# Altium footprint library Indruino.PcbLib: 383 footprints (part 19 of 24)
Each footprint in its own frame and in the unit in brackets; x right, y up, seen from the top. Pads: shape width x height; smd on the part's side, far side on the other; paste and mask are expansions set on the pad; w line width, h text height; cw(c..) or ccw(c..) is an arc to the next point about the centre after c.
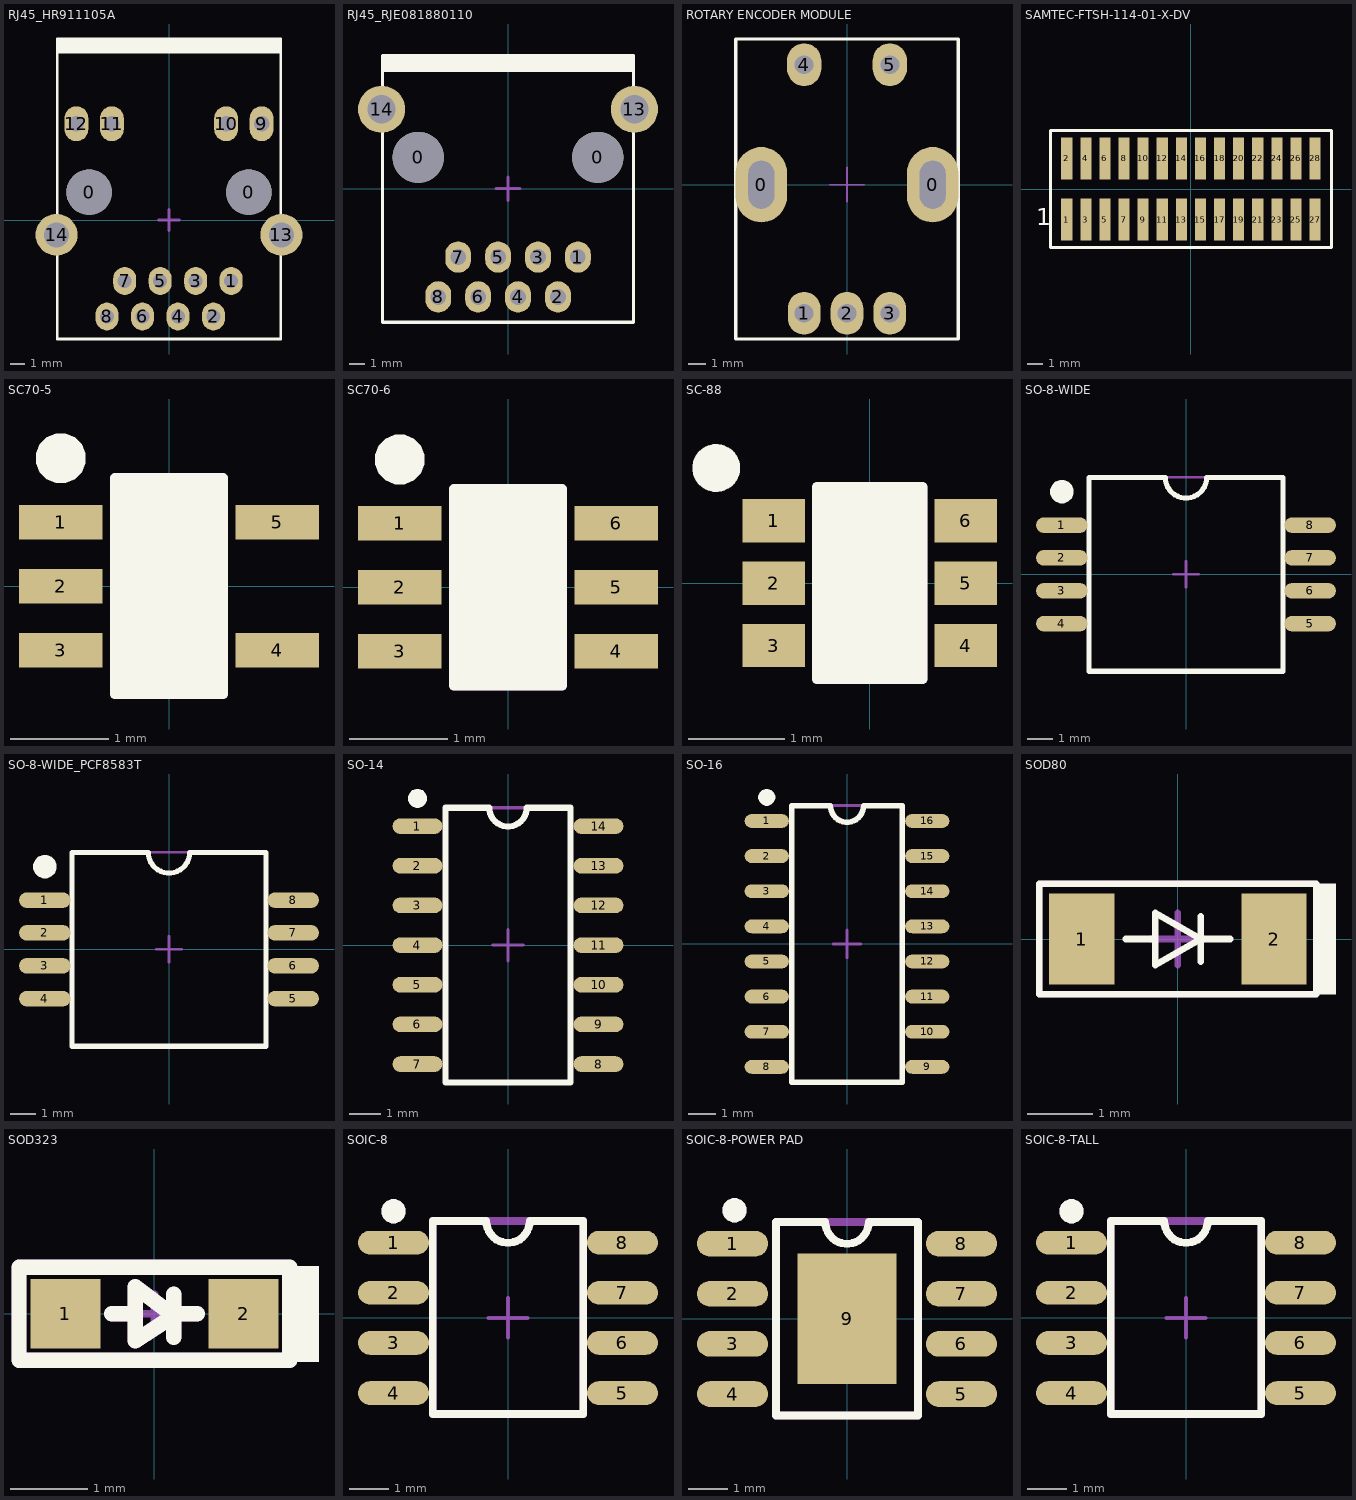
[diagram p18: the footprints below, top view; thin cyan lines are the x and y axes]

## RJ45_HR911105A [mm]
pads (16):
  round 3.25 hole 3.25: 0(-5.715,1.995) 0(5.715,1.995)
  oval 1.65x2 hole 1: 1(4.45,-4.355) 2(3.18,-6.895) 3(1.91,-4.355) 4(0.64,-6.895) 5(-0.63,-4.355) 6(-1.9,-6.895) 7(-3.17,-4.355) 8(-4.44,-6.895)
  oval 1.7x2.5 hole 1.1: 9(6.625,6.895) 10(4.085,6.895) 11(-4.085,6.895) 12(-6.625,6.895)
  round 3 hole 1.8: 13(8.05,-1.055) 14(-8.05,-1.055)
Top Overlay:
  rectangle: -8.001,11.931 8.001,12.961
  lines w0.2: -8.001,-8.509 8.001,-8.509 8.001,12.961 -8.001,12.961 -8.001,-8.509
Mechanical 15:
  lines w0.2: -0.75,0 0.75,0 ; 0,-0.75 0,0.75
3D body "User Library-HR911105A.step": height 13.5, standoff -3, extent -7.94,-8.509 7.94,12.891

## RJ45_RJE081880110 [mm] "Jack Modular Connector 8p8c (RJ45, Ethernet) Vertical Unshielded"
pads (12):
  round 3.25 hole 3.25: 0(-5.715,1.995) 0(5.715,1.995)
  oval 1.65x2 hole 1: 1(4.45,-4.355) 2(3.18,-6.895) 3(1.91,-4.355) 4(0.64,-6.895) 5(-0.63,-4.355) 6(-1.9,-6.895) 7(-3.17,-4.355) 8(-4.44,-6.895)
  round 3 hole 1.8: 13(8.05,5.045) 14(-8.05,5.045)
Top Overlay:
  rectangle: -8.001,7.431 8.001,8.461
  lines w0.2: -8.001,-8.509 8.001,-8.509 8.001,8.46 8,8.461 -8.001,8.461 -8.001,-8.509
Mechanical 15:
  lines w0.2: -0.75,0 0.75,0 ; 0,-0.75 0,0.75
3D body "RJE08-188-0110-REVT1.step": height 16.38, standoff -3.9, extent -7.75,-8.05 7.75,8.45

## ROTARY ENCODER MODULE [mm]
pads (7):
  oval 3x4.4 hole 2.8 slot 1.5 at 0 deg: 0(-5,0) 0(5,0)
  oval 1.9x2.5 hole 1.1: 1(-2.5,-7.5) 2(0,-7.5) 3(2.5,-7.5)
  oval 2x2.5 hole 1.1: 4(-2.5,7) 5(2.5,7)
Top Overlay:
  lines w0.2: -6.5,-9 -6.5,8.5 6.5,8.5 6.5,-9 -6.5,-9
Mechanical 13:
  lines w0.1: -6.5,-9 6.5,-9 6.5,8.5 -6.5,8.5 -6.5,-9
Mechanical 15:
  lines w0.1: -1,0 1,0 ; 0,-1 0,1
3D body "EC11E-05SW.STEP": height 24.5, standoff -3.7, extent -6.539,-7.729 6.56,7.221

## SAMTEC-FTSH-114-01-X-DV [mil]
height 60
pads (28):
  rect 29.13x109.84 smd: 1(-325,-80) 2(-325,80) 3(-275,-80) 4(-275,80) 5(-225,-80) 6(-225,80) 7(-175,-80) 8(-175,80) 9(-125,-80) 10(-125,80) 11(-75,-80) 12(-75,80) 13(-25,-80) 14(-25,80) 15(25,-80) 16(25,80) 17(75,-80) 18(75,80) 19(125,-80) 20(125,80) 21(175,-80) 22(175,80) 23(225,-80) 24(225,80) 25(275,-80) 26(275,80) 27(325,-80) 28(325,80)
Top Overlay:
  lines w7.87: -367.72,-152.68 -367.72,152.68 367.72,152.68 367.72,-152.68 -367.72,-152.68
  text "1" at -405.51,-110.24 h77.5
Top Paste:
  rectangle: -339.57,-134.92 -310.43,-25.08
  rectangle: -339.57,25.08 -310.43,134.92
  rectangle: -289.57,-134.92 -260.43,-25.08
  rectangle: -289.57,25.08 -260.43,134.92
  rectangle: -239.57,-134.92 -210.43,-25.08
  rectangle: -239.57,25.08 -210.43,134.92
  rectangle: -189.57,-134.92 -160.43,-25.08
  rectangle: -189.57,25.08 -160.43,134.92
  rectangle: -139.57,-134.92 -110.43,-25.08
  rectangle: -139.57,25.08 -110.43,134.92
  rectangle: -89.57,-134.92 -60.43,-25.08
  rectangle: -89.57,25.08 -60.43,134.92
  rectangle: -39.57,-134.92 -10.43,-25.08
  rectangle: -39.57,25.08 -10.43,134.92
  rectangle: 10.43,-134.92 39.57,-25.08
  rectangle: 10.43,25.08 39.57,134.92
  rectangle: 60.43,-134.92 89.57,-25.08
  rectangle: 60.43,25.08 89.57,134.92
  rectangle: 110.43,-134.92 139.57,-25.08
  rectangle: 110.43,25.08 139.57,134.92
  rectangle: 160.43,-134.92 189.57,-25.08
  rectangle: 160.43,25.08 189.57,134.92
  rectangle: 210.43,-134.92 239.57,-25.08
  rectangle: 210.43,25.08 239.57,134.92
  rectangle: 260.43,-134.92 289.57,-25.08
  rectangle: 260.43,25.08 289.57,134.92
  rectangle: 310.43,-134.92 339.57,-25.08
  rectangle: 310.43,25.08 339.57,134.92
Top Solder:
  rectangle: -341.58,-136.93 -308.43,-23.07
  rectangle: -341.58,23.07 -308.43,136.93
  rectangle: -291.58,-136.93 -258.43,-23.07
  rectangle: -291.58,23.07 -258.43,136.93
  rectangle: -241.58,-136.93 -208.43,-23.07
  rectangle: -241.58,23.07 -208.43,136.93
  rectangle: -191.58,-136.93 -158.43,-23.07
  rectangle: -191.58,23.07 -158.43,136.93
  rectangle: -141.58,-136.93 -108.43,-23.07
  rectangle: -141.58,23.07 -108.43,136.93
  rectangle: -91.58,-136.93 -58.43,-23.07
  rectangle: -91.58,23.07 -58.43,136.93
  rectangle: -41.58,-136.93 -8.43,-23.07
  rectangle: -41.58,23.07 -8.43,136.93
  rectangle: 8.43,-136.93 41.58,-23.07
  rectangle: 8.43,23.07 41.58,136.93
  rectangle: 58.43,-136.93 91.58,-23.07
  rectangle: 58.43,23.07 91.58,136.93
  rectangle: 108.43,-136.93 141.58,-23.07
  rectangle: 108.43,23.07 141.58,136.93
  rectangle: 158.43,-136.93 191.58,-23.07
  rectangle: 158.43,23.07 191.58,136.93
  rectangle: 208.43,-136.93 241.58,-23.07
  rectangle: 208.43,23.07 241.58,136.93
  rectangle: 258.43,-136.93 291.58,-23.07
  rectangle: 258.43,23.07 291.58,136.93
  rectangle: 308.43,-136.93 341.58,-23.07
  rectangle: 308.43,23.07 341.58,136.93
Mechanical 40:
  text "3.429" at -620.98,-5 h15.5
  text "4.064" at -548.5,-5 h15.5
  text "1.270" at -428.5,190 h15.5
  text "17.780" at -31.5,45 h15.5
  text "16.510" at -31.5,230 h15.5
  text "2.794" at 379.02,75 h15.5
  text "0.762" at 391.5,162.52 h15.5

## SC70-5 [mm] "SC70 5-Leads, Body 2.15x2.4mm, Pitch 0.65mm"
height 1.1
pads (5):
  rect 0.85x0.35 smd: 1(-1.1,0.65) 2(-1.1,0) 3(-1.1,-0.65) 4(1.1,-0.65) 5(1.1,0.65)
Top Overlay:
  region: -0.55,-1.1 0.55,-1.1 0.55,1.1 -0.55,1.1
  region: -1.1,1.05 -1.15,1.05 -1.242,1.088 -1.312,1.158 -1.35,1.25 -1.35,1.3 -1.35,1.35 -1.312,1.442 -1.242,1.512 -1.15,1.55 -1.1,1.55 -1.05,1.55 -0.958,1.512 -0.888,1.442 -0.85,1.35 -0.85,1.3 -0.85,1.25 -0.888,1.158 -0.958,1.088 -1.05,1.05
  lines w0.1: -0.55,-1.1 -0.55,1.1 0.55,1.1 0.55,-1.1 -0.55,-1.1
Mechanical 13:
  lines w0.1: -0.55,-1.1 0.55,-1.1 0.55,1.1 -0.55,1.1 -0.55,-1.1
Mechanical 15:
  lines w0.1: -0.35,0 0.35,0 ; 0,-0.35 0,0.35
3D body "User Library-SOT353-1.STEP": height 1.1, standoff 0, extent -1.2,-1.1 1.2,1.1

## SC70-6 [mm] "SC70 6-Leads, Body 2.15x2.4mm, Pitch 0.65mm"
height 1.1
pads (6):
  rect 0.85x0.35 smd: 1(-1.1,0.65) 2(-1.1,0) 3(-1.1,-0.65) 4(1.1,-0.65) 5(1.1,0) 6(1.1,0.65)
Top Overlay:
  region: -0.55,-1 0.55,-1 0.55,1 -0.55,1
  region: -1.1,1.05 -1.15,1.05 -1.242,1.088 -1.312,1.158 -1.35,1.25 -1.35,1.3 -1.35,1.35 -1.312,1.442 -1.242,1.512 -1.15,1.55 -1.1,1.55 -1.05,1.55 -0.958,1.512 -0.888,1.442 -0.85,1.35 -0.85,1.3 -0.85,1.25 -0.888,1.158 -0.958,1.088 -1.05,1.05
  lines w0.1: -0.55,-1 -0.55,1 0.55,1 0.55,-1 -0.55,-1
Mechanical 13:
  lines w0.1: -0.55,-1 0.55,-1 0.55,1 -0.55,1 -0.55,-1
Mechanical 15:
  lines w0.1: -0.4,0 0.4,0 ; 0,-0.4 0,0.4
3D body "SW3dPS-SC70-6.STEP": height 0.92, standoff -0.03, extent -1.05,-1 1.05,1

## SC-88 [mm] "SOT23, 5-Leads, Body 2.9x1.6mm, Pitch 0.95mm, Lead Span 2.8mm, IPC High Density"
height 1.45
pads (6):
  rect 0.65x0.45 smd: 1(-1,0.65) 2(-1,0) 3(-1,-0.65) 4(1,-0.65) 5(1,0) 6(1,0.65)
Top Overlay:
  circle w0.1: c-1.6,1.2 r0.2
  region: -0.55,-1 0.55,-1 0.55,1.005 -0.55,1.005
  region: -1.6,1 -1.64,1 -1.713,1.03 -1.77,1.087 -1.8,1.16 -1.8,1.2 -1.8,1.24 -1.77,1.313 -1.713,1.37 -1.64,1.4 -1.6,1.4 -1.56,1.4 -1.487,1.37 -1.43,1.313 -1.4,1.24 -1.4,1.2 -1.4,1.16 -1.43,1.087 -1.487,1.03 -1.56,1
  lines w0.1: -0.55,-1 -0.55,1.005 0.55,1.005 0.55,-1 -0.55,-1
Mechanical 13:
  lines w0.1: -0.55,-1 -0.55,1 0.55,1 0.55,-1 -0.55,-1
Mechanical 15:
  lines w0.1: -0.35,0 0.35,0 ; 0,-0.35 0,0.35
3D body "SW3dPS-SC70-6.STEP": height 0.92, standoff -0.03, extent -1.055,-1 1.045,1

## SO-8-WIDE [mm]
pads (8):
  oval 2x0.6 smd: 1(-4.8,1.905) 2(-4.8,0.635) 3(-4.8,-0.635) 4(-4.8,-1.905) 5(4.8,-1.905) 6(4.8,-0.635) 7(4.8,0.635) 8(4.8,1.905)
Top Overlay:
  region: -4.8,2.753 -4.889,2.753 -5.053,2.821 -5.179,2.947 -5.247,3.111 -5.247,3.2 -5.247,3.289 -5.179,3.453 -5.053,3.579 -4.889,3.647 -4.8,3.647 -4.711,3.647 -4.547,3.579 -4.421,3.453 -4.353,3.289 -4.353,3.2 -4.353,3.111 -4.421,2.947 -4.547,2.821 -4.711,2.753
  lines w0.2: -3.75,3.708 -3.75,-3.75 3.75,-3.75 3.75,3.75 0.8,3.75 cw(c0,3.75) -0.8,3.75 -3.75,3.75
Mechanical 13:
  lines w0.1: -3.75,-3.75 3.75,-3.75 3.75,3.75 -3.75,3.75 -3.75,-3.75
Mechanical 15:
  lines w0.1: -0.5,0 0.5,0 ; 0,-0.5 0,0.5
3D body "User Library-SOIC8_Wide_5mmx5mm.step": height 1.75, standoff -0.01, extent -4.052,-2.73 4.05,2.73

## SO-8-WIDE_PCF8583T [mm]
pads (8):
  oval 2x0.6 smd: 1(-4.8,1.905) 2(-4.8,0.635) 3(-4.8,-0.635) 4(-4.8,-1.905) 5(4.8,-1.905) 6(4.8,-0.635) 7(4.8,0.635) 8(4.8,1.905)
Top Overlay:
  region: -4.8,2.753 -4.889,2.753 -5.053,2.821 -5.179,2.947 -5.247,3.111 -5.247,3.2 -5.247,3.289 -5.179,3.453 -5.053,3.579 -4.889,3.647 -4.8,3.647 -4.711,3.647 -4.547,3.579 -4.421,3.453 -4.353,3.289 -4.353,3.2 -4.353,3.111 -4.421,2.947 -4.547,2.821 -4.711,2.753
  lines w0.2: -3.75,3.708 -3.75,-3.75 3.75,-3.75 3.75,3.75 0.8,3.75 cw(c0,3.75) -0.8,3.75 -3.75,3.75
Mechanical 13:
  lines w0.1: -3.75,-3.75 3.75,-3.75 3.75,3.75 -3.75,3.75 -3.75,-3.75
Mechanical 15:
  lines w0.1: -0.5,0 0.5,0 ; 0,-0.5 0,0.5
3D body "User Library-SOIC-8-W7_5mm(SOT176-1).STEP": height 2.5, standoff 0, extent -5.267,-3.825 5.268,3.825

## SO-14 [mm]
pads (14):
  oval 1.6x0.5 smd: 1(-2.9,3.81) 2(-2.9,2.54) 3(-2.9,1.27) 4(-2.9,0) 5(-2.9,-1.27) 6(-2.9,-2.54) 7(-2.9,-3.81) 8(2.9,-3.81) 9(2.9,-2.54) 10(2.9,-1.27) 11(2.9,0) 12(2.9,1.27) 13(2.9,2.54) 14(2.9,3.81)
Top Overlay:
  region: -2.9,4.4 -2.84,4.4 -2.73,4.446 -2.646,4.53 -2.6,4.64 -2.6,4.7 -2.6,4.76 -2.646,4.87 -2.73,4.954 -2.84,5 -2.9,5 -2.96,5 -3.07,4.954 -3.154,4.87 -3.2,4.76 -3.2,4.7 -3.2,4.64 -3.154,4.53 -3.07,4.446 -2.96,4.4
  lines w0.2: -2,-4.4 -2,4.4 -0.6,4.4 ccw(c0,4.4) 0.6,4.4 2,4.4 2,-4.4 -2,-4.4
Mechanical 13:
  lines w0.1: -2,-4.4 2,-4.4 2,4.4 -2,4.4 -2,-4.4
Mechanical 15:
  lines w0.1: -0.5,0 0.5,0 ; 0,-0.5 0,0.5
3D body "User Library-so14-1.step": height 1.7, standoff 0, extent -3,-4.4 3,4.4

## SO-16 [mm]
pads (16):
  oval 1.6x0.5 smd: 1(-2.9,4.445) 2(-2.9,3.175) 3(-2.9,1.905) 4(-2.9,0.635) 5(-2.9,-0.635) 6(-2.9,-1.905) 7(-2.9,-3.175) 8(-2.9,-4.445) 9(2.9,-4.445) 10(2.9,-3.175) 11(2.9,-1.905) 12(2.9,-0.635) 13(2.9,0.635) 14(2.9,1.905) 15(2.9,3.175) 16(2.9,4.445)
Top Overlay:
  region: -2.9,5 -2.84,5 -2.73,5.046 -2.646,5.13 -2.6,5.24 -2.6,5.3 -2.6,5.36 -2.646,5.47 -2.73,5.554 -2.84,5.6 -2.9,5.6 -2.96,5.6 -3.07,5.554 -3.154,5.47 -3.2,5.36 -3.2,5.3 -3.2,5.24 -3.154,5.13 -3.07,5.046 -2.96,5
  lines w0.2: -2,-5 2,-5 2,5 0.6,5 cw(c0,5) -0.6,5 -2,5 -2,-5
Mechanical 13:
  lines w0.1: -2,-5 -2,5 2,5 2,-5 -2,-5
Mechanical 15:
  lines w0.1: -0.5,0 0.5,0 ; 0,-0.5 0,0.5
3D body "User Library-so16-1.STEP": height 1.77, standoff 0, extent -3.068,-4.985 3.069,4.985

## SOD80 [mm] "Diodes - General Purpose"
pads (2):
  rect 1x1.4 smd: 1(-1.475,0) 2(1.475,0)
Top Overlay:
  rectangle: 2.125,-0.85 2.425,0.85
  lines w0.1: -0.8,0 -0.35,0 ; 0.35,-0.35 0.35,0.35 ; 0.8,0 0.35,0 ; 0.35,0 -0.35,-0.4 -0.35,0.4 0.35,0 ; -2.125,-0.85 2.125,-0.85 2.125,0.85 -2.125,0.85 -2.125,-0.85
Mechanical 13:
  lines w0.1: -2.125,-0.85 -2.125,0.85 2.125,0.85 2.125,-0.85 -2.125,-0.85
Mechanical 15:
  lines w0.1: -0.4,0 0.4,0 ; 0,-0.4 0,0.4
3D body "User Library-smd diode 1206.STEP": height 1.43, standoff -0.02, extent -1.74,-0.72 1.76,0.73

## SOD323 [mm] "SM LED; 2 Gull Wing Leads; Body 2.2 x 2.1 mm, (LxW)"
height 2.2
pads (2):
  rect 0.9x0.9 smd: 1(-1.15,0) 2(1.15,0)
Top Overlay:
  rectangle: 1.75,-0.624 2.125,0.619
  lines w0.2: -0.55,0 -0.25,0 ; 0.25,-0.3 0.25,0.25 ; 0.25,0 0.55,0 ; -1.75,-0.6 -1.75,0.6 1.75,0.6 1.75,-0.6 -1.75,-0.6 ; -0.25,-0.35 -0.25,0.35 0.25,-0.025 -0.25,-0.35
Mechanical 13:
  rectangle: 1.75,-0.624 2.125,0.619
  lines w0.2: -0.55,0 -0.25,0 ; 0.25,-0.3 0.25,0.25 ; 0.25,0 0.55,0 ; -1.75,-0.6 -1.75,0.6 1.75,0.6 1.75,-0.6 -1.75,-0.6 ; -0.25,-0.35 -0.25,0.35 0.25,-0.025 -0.25,-0.35
  text "'.Designator'" at -1.505,-0.397 h0.7
Mechanical 15:
  lines w0.1: -0.25,0 0.25,0 ; 0,-0.25 0,0.25
3D body "User Library-SOD2513X11.STEP": height 1.1, standoff 0, extent -1.37,-0.615 1.33,0.635

## SOIC-8 [mm]
pads (8):
  oval 1.8x0.6 smd: 1(-2.9,1.905) 2(-2.9,0.635) 3(-2.9,-0.635) 4(-2.9,-1.905) 5(2.9,-1.905) 6(2.9,-0.635) 7(2.9,0.635) 8(2.9,1.905)
Top Overlay:
  region: -2.9,2.4 -2.96,2.4 -3.07,2.446 -3.154,2.53 -3.2,2.64 -3.2,2.7 -3.2,2.76 -3.154,2.87 -3.07,2.954 -2.96,3 -2.9,3 -2.84,3 -2.73,2.954 -2.646,2.87 -2.6,2.76 -2.6,2.7 -2.6,2.64 -2.646,2.53 -2.73,2.446 -2.84,2.4
  lines w0.2: -1.905,-2.44 -1.905,2.45 -0.55,2.45 ccw(c0,2.45) 0.55,2.45 1.905,2.45 1.905,-2.44 -1.905,-2.44
Mechanical 13:
  region: -2.9,2.4 -2.96,2.4 -3.07,2.446 -3.154,2.53 -3.2,2.64 -3.2,2.7 -3.2,2.76 -3.154,2.87 -3.07,2.954 -2.96,3 -2.9,3 -2.84,3 -2.73,2.954 -2.646,2.87 -2.6,2.76 -2.6,2.7 -2.6,2.64 -2.646,2.53 -2.73,2.446 -2.84,2.4
  lines w0.2: -1.905,-2.44 -1.905,2.45 1.905,2.45 1.905,-2.44 -1.905,-2.44
  text "'.Designator'" at -0.5,1.95 h1.2
Mechanical 15:
  lines w0.1: -0.5,0 0.5,0 ; 0,-0.5 0,0.5
3D body "User Library-SOIC-8-1.STEP": height 1.75, standoff 0, extent -3.01,-2.45 2.99,2.45

## SOIC-8-POWER PAD [mm]
pads (9):
  oval 1.8x0.65 smd: 1(-2.9,1.905) 2(-2.9,0.635) 3(-2.9,-0.635) 4(-2.9,-1.905) 5(2.9,-1.905) 6(2.9,-0.635) 7(2.9,0.635) 8(2.9,1.905)
  rect 2.5x3.3 smd: 9(0,0)
Top Overlay:
  region: -2.85,2.45 -2.91,2.45 -3.02,2.496 -3.104,2.58 -3.15,2.69 -3.15,2.75 -3.15,2.81 -3.104,2.92 -3.02,3.004 -2.91,3.05 -2.85,3.05 -2.79,3.05 -2.68,3.004 -2.596,2.92 -2.55,2.81 -2.55,2.75 -2.55,2.69 -2.596,2.58 -2.68,2.496 -2.79,2.45
  lines w0.2: -1.8,-2.45 -1.8,2.45 -0.55,2.45 ccw(c0,2.45) 0.55,2.45 1.8,2.45 1.8,-2.45 -1.8,-2.45
Mechanical 13:
  region: -2.85,2.45 -2.91,2.45 -3.02,2.496 -3.104,2.58 -3.15,2.69 -3.15,2.75 -3.15,2.81 -3.104,2.92 -3.02,3.004 -2.91,3.05 -2.85,3.05 -2.79,3.05 -2.68,3.004 -2.596,2.92 -2.55,2.81 -2.55,2.75 -2.55,2.69 -2.596,2.58 -2.68,2.496 -2.79,2.45
  lines w0.2: -1.8,-2.45 1.8,-2.45 1.8,2.45 -1.8,2.45 -1.8,-2.45
  text "'.Designator'" at -0.5,1.95 h1.2
Mechanical 15:
  lines w0.1: -0.5,0 0.5,0 ; 0,-0.5 0,0.5
3D body "User Library-SOIC127P500X620X175-8.STEP": height 1.75, standoff 0, extent -3.139,-2.49 3.09,2.51

## SOIC-8-TALL [mm]
pads (8):
  oval 1.8x0.6 smd: 1(-2.9,1.905) 2(-2.9,0.635) 3(-2.9,-0.635) 4(-2.9,-1.905) 5(2.9,-1.905) 6(2.9,-0.635) 7(2.9,0.635) 8(2.9,1.905)
Top Overlay:
  region: -2.9,2.4 -2.96,2.4 -3.07,2.446 -3.154,2.53 -3.2,2.64 -3.2,2.7 -3.2,2.76 -3.154,2.87 -3.07,2.954 -2.96,3 -2.9,3 -2.84,3 -2.73,2.954 -2.646,2.87 -2.6,2.76 -2.6,2.7 -2.6,2.64 -2.646,2.53 -2.73,2.446 -2.84,2.4
  lines w0.2: -1.905,-2.44 -1.905,2.45 -0.55,2.45 ccw(c0,2.45) 0.55,2.45 1.905,2.45 1.905,-2.44 -1.905,-2.44
Mechanical 13:
  region: -2.9,2.4 -2.96,2.4 -3.07,2.446 -3.154,2.53 -3.2,2.64 -3.2,2.7 -3.2,2.76 -3.154,2.87 -3.07,2.954 -2.96,3 -2.9,3 -2.84,3 -2.73,2.954 -2.646,2.87 -2.6,2.76 -2.6,2.7 -2.6,2.64 -2.646,2.53 -2.73,2.446 -2.84,2.4
  lines w0.2: -1.905,-2.44 -1.905,2.45 1.905,2.45 1.905,-2.44 -1.905,-2.44
  text "'.Designator'" at -0.5,1.95 h1.2
Mechanical 15:
  lines w0.1: -0.5,0 0.5,0 ; 0,-0.5 0,0.5
3D body "User Library-SOIC127P610X343-8N.STEP": height 3.48, standoff 0, extent -3.01,-2.92 2.99,2.92